# Altium footprint library NDLib.PCBLIB: 499 footprints (part 28 of 32)
Each footprint in its own frame and in the unit in brackets; x right, y up, seen from the top. Pads: shape width x height; smd on the part's side, far side on the other; paste and mask are expansions set on the pad; w line width, h text height; cw(c..) or ccw(c..) is an arc to the next point about the centre after c.
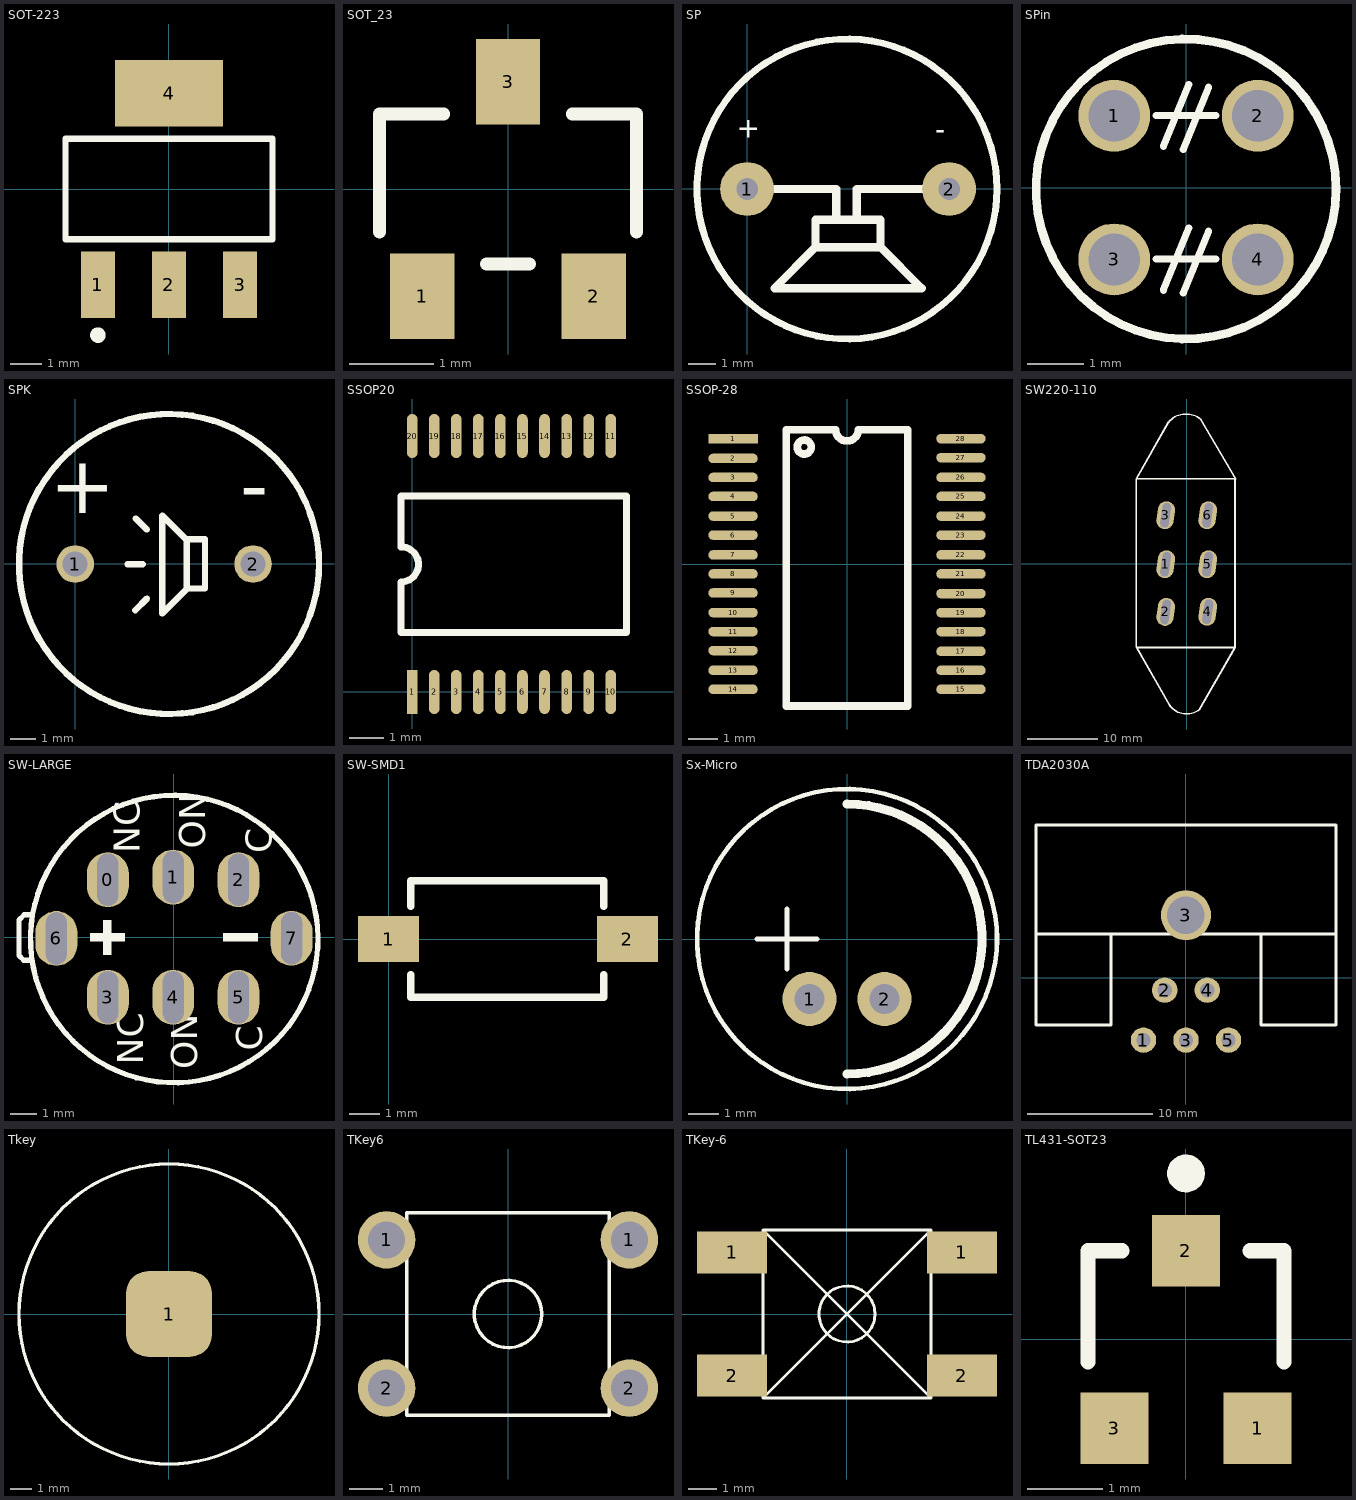
[diagram p27: the footprints below, top view; thin cyan lines are the x and y axes]

## SOT-223 [mm] "SOT-223/SC-73; 4 Leads; Body 6.7 x 7.3 mm, inc. leads (LxW max)"
height 1.78
pads (4):
  rect 1.1x2.15 smd: 1(-2.3,-3.1) 2(0,-3.1) 3(2.3,-3.1)
  rect 3.5x2.15 smd: 4(0,3.1)
TopOverlay:
  circle w0.25: c-2.3,-4.725 r0.125
  lines w0.2: -3.35,-1.625 3.35,-1.625 3.35,1.625 -3.35,1.625 -3.35,-1.625
3D body: height 1.65, standoff -0.03, extent -3.251,-3.58 3.249,3.38

## SOT_23 [mil]
pads (3):
  rect 30x40 smd: 1(-40,-50) 2(40,-50) 3(0,50)
TopOverlay:
  lines w6: -60,-20 -60,35 -30,35 ; -10,-35 10,-35 ; 30,35 60,35 60,-20

## SP [mm]
pads (2):
  round 2 hole 0.8: 1(-0.007,-0.004) 2(7.486,-0.004)
TopOverlay:
  circle w0.254: c3.697,-0.004 r5.566
  lines w0.305: -0.007,-0.004 3.295,-0.004 3.295,-1.147 ; 4.057,-1.147 4.057,-0.004 7.486,-0.004 ; 2.533,-2.163 2.533,-1.147 4.946,-1.147 4.946,-2.163 ; 2.533,-2.163 1.009,-3.687 6.47,-3.687 4.946,-2.163 ; 2.533,-2.163 4.946,-2.163
  text "-" at 6.975,2.413 h0.76
  text "+" at -0.391,2.54 h0.76

## SPin [mil]
pads (4):
  round 50 hole 36: 1(-50,50) 2(50,50) 3(-50,-50) 4(50,-50)
TopOverlay:
  circle w6: c0,-0.98 r104.43
  lines w5: -20.67,-49.8 20.67,-49.8 ; -20.67,50.2 20.67,50.2 ; -15.75,-71.46 1.97,-28.15 ; -15.75,28.54 1.97,71.85 ; -1.97,-73.43 15.75,-30.12 ; -1.97,26.57 15.75,69.88

## SPK [mm]
pads (2):
  round 1.5 / inner round 1.5 / far side round 2.5 hole 1: 1(-0.007,-0.008) 2(7.105,-0.008)
TopOverlay:
  circle w0.254: c3.743,-0.008 r6
  lines w0.254: 2.083,-0.018 2.693,-0.018 ; 2.393,-1.858 2.863,-1.388 ; 2.412,1.813 2.852,1.373 ; 3.473,1.922 3.473,-1.988 4.483,-0.978 ; 3.483,1.922 4.433,0.972 ; 4.453,-0.968 4.453,0.982 ; 4.463,-0.988 5.173,-0.988 ; 4.513,0.982 5.183,0.982 5.183,-0.988
  text "-" at 6.597,2.023 h2.29
  text "+" at -1.023,2.023 h2.29
3D body: height 9, standoff -2, extent -2.257,-6.008 9.743,5.992

## SSOP20 [mil]
pads (20):
  rect 12x50 smd: 1(0,0)
  oval 12x50 smd: 2(25,0) 3(50,0) 4(75,0) 5(100,0) 6(125,0) 7(150,0) 8(175,0) 9(200,0) 10(225,0) 11(225,290) 12(200,290) 13(175,290) 14(150,290) 15(125,290) 16(100,290) 17(75,290) 18(50,290) 19(25,290) 20(0,290)
TopOverlay:
  lines w7.87: -12.79,124 -12.79,67.24 243.11,67.24 243.11,221.97 -12.79,221.97 -12.79,164 ; -12.8,124.61 ccw(c-12.79,144.61) -12.79,164.61

## SSOP-28 [mil]
pads (28):
  rect 65x12.5 smd: 1(-150,165)
  oval 65x12.5 smd: 2(-150,139) 3(-150,114) 4(-150,89) 5(-150,63) 6(-150,38) 7(-150,12) 8(-150,-13) 9(-150,-38) 10(-150,-64) 11(-150,-89) 12(-150,-114) 13(-150,-140) 14(-150,-165) 15(150,-165) 16(150,-140) 17(150,-115) 18(150,-89) 19(150,-64) 20(150,-39) 21(150,-13) 22(150,12) 23(150,38) 24(150,63) 25(150,89) 26(150,114) 27(150,140) 28(150,165)
TopOverlay:
  circle w10: c-56.22,154 r9.22
  lines w10: -80,-187 80,-187 80,177 15,177 cw(c0,177) -15,177 -80,177 -80,-187

## SW220-110 [mm]
height 10
pads (6):
  oval 2.5x4 hole 1.2 slot 3.5 at 82 deg rot 172: 1(-3.005,-0.095) 2(-3.005,-6.905) 3(-3.005,6.905) 4(3.005,-6.885) 5(2.995,-0.095) 6(2.995,6.905)
TopOverlay:
  lines w0.2: -2.605,20.205 cw(c-0.105,18.105) 1.995,20.605 ; -2.405,-20.295 ccw(c-0.005,-18.495) 1.795,-20.895
  lines w0.254: -7.105,-11.995 6.895,-11.995 ; -2.605,20.205 -7.205,12.105 ; -2.405,-20.295 -7.205,-11.895 -7.205,12.105 ; 1.795,-20.895 6.895,-11.995 ; 1.995,20.605 6.995,12.105 ; -7.205,12.105 6.995,12.105 ; 6.895,-11.995 6.895,12.005 6.995,12.105
3D body: height 10, standoff 0, extent -7.332,-21.595 7.122,21.47

## SW-LARGE [mm]
pads (8):
  oval 1.6x2.1 hole 0.8 slot 2 at 90 deg: 0(-2.53,2.205) 1(-0.03,2.305) 2(2.47,2.205) 3(-2.53,-2.295) 4(-0.03,-2.295) 5(2.47,-2.295) 6(-4.5,-0.045) 7(4.5,-0.035)
TopOverlay:
  region: 3.222,-0.157 3.222,0.166 1.88,0.166 1.88,-0.157
  region: -1.88,-0.167 -1.88,0.156 -3.222,0.156 -3.222,-0.167
  rectangle: -2.713,-0.676 -2.39,0.665
  lines w0.2: -5.45,-0.875 -5.75,-0.875 -5.93,-0.695 -5.93,0.665 -5.73,0.865 -5.45,0.865 ; 0.04,5.435 ccw(c0.01,-0.065) 0.07,5.435
  text "NC" at -1.18,-4.875 h1
  text "ON" at 0.9,-5.045 h1
  text "C" at 3.37,-4.345 h1
  text "NC" at -1.31,3.215 h1
  text "ON" at 1.2,3.385 h1
  text "C" at 3.75,3.225 h1

## SW-SMD1 [mm]
pads (2):
  rect 2x1.5 smd: 1(0,0) 2(7.8,0)
TopOverlay:
  lines w0.254: 0.725,-1.168 0.725,-1.9 7.025,-1.9 7.025,-1.168 ; 0.725,1.067 0.725,1.9 7.025,1.9 7.025,1.067
3D body: height 2.5, standoff 0, extent -0.059,-1.945 7.831,1.905

## Sx-Micro [mm]
pads (2):
  round 1.8 hole 1: 1(-1.25,-2) 2(1.25,-2)
TopOverlay:
  circle w0.152: c0,0 r5
  lines w0.152: -3,0 -1,0 ; -2,-1 -2,1
  lines w0.3: 0,-4.5 ccw(c0,0) 0,4.5

## TDA2030A [mil]
height 590.55
pads (6):
  round 80 hole 45: 1(-133.86,-196.85) 2(-66.93,-39.37) 3(0,-196.85) 4(66.93,-39.37) 5(133.86,-196.85)
  round 157.48 hole 118.11: 3(0,196.85)
TopOverlay:
  lines w10: -472.44,137.8 472.44,137.8 ; -236.22,137.8 -236.22,-149.61 -472.44,-149.61 -472.44,480.32 472.44,480.31 472.44,-149.61 236.22,-149.61 236.22,137.8

## Tkey [mm]
pads (1):
  rrect50% 4x4 smd: 1(0,0)
TopOverlay:
  circle w0.152: c0,0 r7

## TKey6 [mm]
height 6.5
pads (4):
  round 1.7 hole 1.1: 1(-3.6,2.2) 1(3.6,2.2) 2(-3.6,-2.2) 2(3.6,-2.2)
TopOverlay:
  circle w0.1: c0,0 r1
  lines w0.1: -3,-3 3,-3 3,3 -3,3 -3,-3

## TKey-6 [mm]
height 5
pads (4):
  rect 2.5x1.5 smd: 1(-4.1,2.2) 1(4.1,2.2) 2(-4.1,-2.2) 2(4.1,-2.2)
TopOverlay:
  circle w0.1: c0,0 r1
  lines w0.1: -3,-3 3,3 ; -3,-3 -3,3 ; -3,-3 3,-3 ; -3,3 3,3 ; -3,3 3,-3 ; 3,-3 3,3

## TL431-SOT23 [mm]
pads (3):
  rect 0.9x0.95 smd: 1(0.95,-1.175) 2(0,1.175) 3(-0.95,-1.175)
TopOverlay:
  circle w0.25: c0,2.2 r0.125
  lines w0.2: -1.3,-0.3 -1.3,1.175 -0.85,1.175 ; 0.85,1.175 1.3,1.175 1.3,-0.3